# Altium schematic symbol library jlcpcb_2025_04_capacitors_extended_0402.schlib: 3594 symbols (part 12 of 20) (continued)
## FN15X102K500PNG
designator C?  Capacitance: 1nF  (hidden comment: *)
Capacitor, Ceramic (MLCC), 1nF, ±10%, 50V, X7R, ±10%, SMD 0402; Manufacturer: PSA(Prosperity Dielectrics); Manufacturer Part Number: FN15X102K500PNG; Package Size: 0402; JLCPCB Basic Part: No; JLCPCB Part Number: C328911; Supplier 1: LCSC; Category: Capacitors - MLCC; Supplier Part Number 1: C328911; Tolerance: ±10%; Voltage Rating: 50V; Temperature Coefficient: X7R; RoHS: Yes; ComponentLink1Description: Datasheet; ComponentLink1URL: https://wmsc.lcsc.com/wmsc/upload/file/pdf/v2/lcsc/2304140030_PSA-Prosperity-Dielectrics-FN15X102K500PNG_C328911.pdf; ComponentLink2Description: JLCPCB Part URL; ComponentLink2URL: https://jlcpcb.com/partdetail/C328911; ComponentLink3Description: LCSC Part URL; ComponentLink3URL: https://lcsc.com/product-detail/Multilayer-Ceramic-Capacitors-MLCC---SMD-SMT_PSAProsperity-Dielectrics-PSAProsperity-Dielectrics-FN15X102K500PNG_C328911.html
footprint CAP-0402 (0402 (1005M) Capacitor)
pins: 1, 2

## FN15X103J500PNG
designator C?  Capacitance: 10nF  (hidden comment: *)
Capacitor, Ceramic (MLCC), 10nF, ±5%, 50V, X7R, ±5%, SMD 0402; Manufacturer: PSA(Prosperity Dielectrics); Manufacturer Part Number: FN15X103J500PNG; Package Size: 0402; JLCPCB Basic Part: No; JLCPCB Part Number: C363529; Supplier 1: LCSC; Category: Capacitors - MLCC; Supplier Part Number 1: C363529; Tolerance: ±5%; Voltage Rating: 50V; Temperature Coefficient: X7R; RoHS: Yes; ComponentLink1Description: Datasheet; ComponentLink1URL: https://wmsc.lcsc.com/wmsc/upload/file/pdf/v2/lcsc/2304140030_PSA-Prosperity-Dielectrics-FN15X103J500PNG_C363529.pdf; ComponentLink2Description: JLCPCB Part URL; ComponentLink2URL: https://jlcpcb.com/partdetail/C363529; ComponentLink3Description: LCSC Part URL; ComponentLink3URL: https://lcsc.com/product-detail/Multilayer-Ceramic-Capacitors-MLCC---SMD-SMT_PSAProsperity-Dielectrics-PSAProsperity-Dielectrics-FN15X103J500PNG_C363529.html
footprint CAP-0402 (0402 (1005M) Capacitor)
pins: 1, 2

## FN15X103K160PNG
designator C?  Capacitance: 10nF  (hidden comment: *)
Capacitor, Ceramic (MLCC), 10nF, 16V, X7R, SMD 0402; Manufacturer: PSA(Prosperity Dielectrics); Manufacturer Part Number: FN15X103K160PNG; Package Size: 0402; JLCPCB Basic Part: No; JLCPCB Part Number: C2875126; Supplier 1: LCSC; Category: Capacitors - MLCC; Supplier Part Number 1: C2875126; Voltage Rating: 16V; Temperature Coefficient: X7R; RoHS: Yes; ComponentLink1Description: Datasheet; ComponentLink1URL: https://wmsc.lcsc.com/wmsc/upload/file/pdf/v2/lcsc/2109171130_PSA-Prosperity-Dielectrics-FN15X103K160PNG_C2875126.pdf; ComponentLink2Description: JLCPCB Part URL; ComponentLink2URL: https://jlcpcb.com/partdetail/C2875126; ComponentLink3Description: LCSC Part URL; ComponentLink3URL: https://lcsc.com/product-detail/Multilayer-Ceramic-Capacitors-MLCC---SMD-SMT_PSAProsperity-Dielectrics-PSAProsperity-Dielectrics-FN15X103K160PNG_C2875126.html
footprint CAP-0402 (0402 (1005M) Capacitor)
pins: 1, 2

## FN15X103K250PNG
designator C?  Capacitance: 10nF  (hidden comment: *)
Capacitor, Ceramic (MLCC), 10nF, ±10%, 25V, X7R, ±10%, SMD 0402; Manufacturer: PSA(Prosperity Dielectrics); Manufacturer Part Number: FN15X103K250PNG; Package Size: 0402; JLCPCB Basic Part: No; JLCPCB Part Number: C525224; Supplier 1: LCSC; Category: Capacitors - MLCC; Supplier Part Number 1: C525224; Tolerance: ±10%; Voltage Rating: 25V; Temperature Coefficient: X7R; RoHS: Yes; ComponentLink1Description: Datasheet; ComponentLink1URL: https://wmsc.lcsc.com/wmsc/upload/file/pdf/v2/lcsc/2304140030_PSA-Prosperity-Dielectrics-FN15X103K250PNG_C525224.pdf; ComponentLink2Description: JLCPCB Part URL; ComponentLink2URL: https://jlcpcb.com/partdetail/C525224; ComponentLink3Description: LCSC Part URL; ComponentLink3URL: https://lcsc.com/product-detail/Multilayer-Ceramic-Capacitors-MLCC---SMD-SMT_PSAProsperity-Dielectrics-PSAProsperity-Dielectrics-FN15X103K250PNG_C525224.html
footprint CAP-0402 (0402 (1005M) Capacitor)
pins: 1, 2

## FN15X103K500PNG
designator C?  Capacitance: 10nF  (hidden comment: *)
Capacitor, Ceramic (MLCC), 10nF, ±10%, 50V, X7R, ±10%, SMD 0402; Manufacturer: PSA(Prosperity Dielectrics); Manufacturer Part Number: FN15X103K500PNG; Package Size: 0402; JLCPCB Basic Part: No; JLCPCB Part Number: C328912; Supplier 1: LCSC; Category: Capacitors - MLCC; Supplier Part Number 1: C328912; Tolerance: ±10%; Voltage Rating: 50V; Temperature Coefficient: X7R; RoHS: Yes; ComponentLink1Description: Datasheet; ComponentLink1URL: https://wmsc.lcsc.com/wmsc/upload/file/pdf/v2/lcsc/2304140030_PSA-Prosperity-Dielectrics-FN15X103K500PNG_C328912.pdf; ComponentLink2Description: JLCPCB Part URL; ComponentLink2URL: https://jlcpcb.com/partdetail/C328912; ComponentLink3Description: LCSC Part URL; ComponentLink3URL: https://lcsc.com/product-detail/Multilayer-Ceramic-Capacitors-MLCC---SMD-SMT_PSAProsperity-Dielectrics-PSAProsperity-Dielectrics-FN15X103K500PNG_C328912.html
footprint CAP-0402 (0402 (1005M) Capacitor)
pins: 1, 2

## FN15X104J160PNG
designator C?  Capacitance: 100nF  (hidden comment: *)
Capacitor, Ceramic (MLCC), 100nF, ±5%, 16V, X7R, ±5%, SMD 0402; Manufacturer: PSA(Prosperity Dielectrics); Manufacturer Part Number: FN15X104J160PNG; Package Size: 0402; JLCPCB Basic Part: No; JLCPCB Part Number: C363530; Supplier 1: LCSC; Category: Capacitors - MLCC; Supplier Part Number 1: C363530; Tolerance: ±5%; Voltage Rating: 16V; Temperature Coefficient: X7R; RoHS: Yes; ComponentLink1Description: Datasheet; ComponentLink1URL: https://wmsc.lcsc.com/wmsc/upload/file/pdf/v2/lcsc/2304140030_PSA-Prosperity-Dielectrics-FN15X104J160PNG_C363530.pdf; ComponentLink2Description: JLCPCB Part URL; ComponentLink2URL: https://jlcpcb.com/partdetail/C363530; ComponentLink3Description: LCSC Part URL; ComponentLink3URL: https://lcsc.com/product-detail/Multilayer-Ceramic-Capacitors-MLCC---SMD-SMT_PSAProsperity-Dielectrics-PSAProsperity-Dielectrics-FN15X104J160PNG_C363530.html
footprint CAP-0402 (0402 (1005M) Capacitor)
pins: 1, 2

## FN15X104K160PNG
designator C?  Capacitance: 100nF  (hidden comment: *)
Capacitor, Ceramic (MLCC), 100nF, ±10%, 16V, X7R, ±10%, SMD 0402; Manufacturer: PSA(Prosperity Dielectrics); Manufacturer Part Number: FN15X104K160PNG; Package Size: 0402; JLCPCB Basic Part: No; JLCPCB Part Number: C328914; Supplier 1: LCSC; Category: Capacitors - MLCC; Supplier Part Number 1: C328914; Tolerance: ±10%; Voltage Rating: 16V; Temperature Coefficient: X7R; RoHS: Yes; ComponentLink1Description: Datasheet; ComponentLink1URL: https://wmsc.lcsc.com/wmsc/upload/file/pdf/v2/lcsc/2304140030_PSA-Prosperity-Dielectrics-FN15X104K160PNG_C328914.pdf; ComponentLink2Description: JLCPCB Part URL; ComponentLink2URL: https://jlcpcb.com/partdetail/C328914; ComponentLink3Description: LCSC Part URL; ComponentLink3URL: https://lcsc.com/product-detail/Multilayer-Ceramic-Capacitors-MLCC---SMD-SMT_PSAProsperity-Dielectrics-PSAProsperity-Dielectrics-FN15X104K160PNG_C328914.html
footprint CAP-0402 (0402 (1005M) Capacitor)
pins: 1, 2

## FN15X104K250PNG
designator C?  Capacitance: 100nF  (hidden comment: *)
Capacitor, Ceramic (MLCC), 100nF, ±10%, 25V, X7R, ±10%, SMD 0402; Manufacturer: PSA(Prosperity Dielectrics); Manufacturer Part Number: FN15X104K250PNG; Package Size: 0402; JLCPCB Basic Part: No; JLCPCB Part Number: C525225; Supplier 1: LCSC; Category: Capacitors - MLCC; Supplier Part Number 1: C525225; Tolerance: ±10%; Voltage Rating: 25V; Temperature Coefficient: X7R; RoHS: Yes; ComponentLink1Description: Datasheet; ComponentLink1URL: https://wmsc.lcsc.com/wmsc/upload/file/pdf/v2/lcsc/2304140030_PSA-Prosperity-Dielectrics-FN15X104K250PNG_C525225.pdf; ComponentLink2Description: JLCPCB Part URL; ComponentLink2URL: https://jlcpcb.com/partdetail/C525225; ComponentLink3Description: LCSC Part URL; ComponentLink3URL: https://lcsc.com/product-detail/Multilayer-Ceramic-Capacitors-MLCC---SMD-SMT_PSAProsperity-Dielectrics-PSAProsperity-Dielectrics-FN15X104K250PNG_C525225.html
footprint CAP-0402 (0402 (1005M) Capacitor)
pins: 1, 2

## FN15X104K500PKG
designator C?  Capacitance: 100nF  (hidden comment: *)
Capacitor, Ceramic (MLCC), 100nF, ±10%, 50V, X7R, ±10%, SMD 0402; Manufacturer: PSA(Prosperity Dielectrics); Manufacturer Part Number: FN15X104K500PKG; Package Size: 0402; JLCPCB Basic Part: No; JLCPCB Part Number: C525226; Supplier 1: LCSC; Category: Capacitors - MLCC; Supplier Part Number 1: C525226; Tolerance: ±10%; Voltage Rating: 50V; Temperature Coefficient: X7R; RoHS: Yes; ComponentLink1Description: Datasheet; ComponentLink1URL: https://wmsc.lcsc.com/wmsc/upload/file/pdf/v2/lcsc/2304140030_PSA-Prosperity-Dielectrics-FN15X104K500PKG_C525226.pdf; ComponentLink2Description: JLCPCB Part URL; ComponentLink2URL: https://jlcpcb.com/partdetail/C525226; ComponentLink3Description: LCSC Part URL; ComponentLink3URL: https://lcsc.com/product-detail/Multilayer-Ceramic-Capacitors-MLCC---SMD-SMT_PSAProsperity-Dielectrics-PSAProsperity-Dielectrics-FN15X104K500PKG_C525226.html
footprint CAP-0402 (0402 (1005M) Capacitor)
pins: 1, 2

## FN15X104M160PNG
designator C?  Capacitance: 100nF  (hidden comment: *)
Capacitor, Ceramic (MLCC), 100nF, 16V, X7R, SMD 0402; Manufacturer: PSA(Prosperity Dielectrics); Manufacturer Part Number: FN15X104M160PNG; Package Size: 0402; JLCPCB Basic Part: No; JLCPCB Part Number: C2874745; Supplier 1: LCSC; Category: Capacitors - MLCC; Supplier Part Number 1: C2874745; Voltage Rating: 16V; Temperature Coefficient: X7R; RoHS: Yes; ComponentLink1Description: Datasheet; ComponentLink1URL: https://wmsc.lcsc.com/wmsc/upload/file/pdf/v2/lcsc/2108150330_PSA-Prosperity-Dielectrics-FN15X104M160PNG_C2874745.pdf; ComponentLink2Description: JLCPCB Part URL; ComponentLink2URL: https://jlcpcb.com/partdetail/C2874745; ComponentLink3Description: LCSC Part URL; ComponentLink3URL: https://lcsc.com/product-detail/Multilayer-Ceramic-Capacitors-MLCC---SMD-SMT_PSAProsperity-Dielectrics-PSAProsperity-Dielectrics-FN15X104M160PNG_C2874745.html
footprint CAP-0402 (0402 (1005M) Capacitor)
pins: 1, 2

## FN15X151K250PNG
designator C?  Capacitance: 150pF  (hidden comment: *)
Capacitor, Ceramic (MLCC), 150pF, ±10%, 25V, X7R, ±10%, SMD 0402; Manufacturer: PSA(Prosperity Dielectrics); Manufacturer Part Number: FN15X151K250PNG; Package Size: 0402; JLCPCB Basic Part: No; JLCPCB Part Number: C561726; Supplier 1: LCSC; Category: Capacitors - MLCC; Supplier Part Number 1: C561726; Tolerance: ±10%; Voltage Rating: 25V; Temperature Coefficient: X7R; RoHS: Yes; ComponentLink1Description: Datasheet; ComponentLink2Description: JLCPCB Part URL; ComponentLink2URL: https://jlcpcb.com/partdetail/C561726; ComponentLink3Description: LCSC Part URL; ComponentLink3URL: https://lcsc.com/product-detail/Multilayer-Ceramic-Capacitors-MLCC---SMD-SMT_PSAProsperity-Dielectrics-PSAProsperity-Dielectrics-FN15X151K250PNG_C561726.html
footprint CAP-0402 (0402 (1005M) Capacitor)
pins: 1, 2

## FN15X151K500PNG
designator C?  Capacitance: 150pF  (hidden comment: *)
Capacitor, Ceramic (MLCC), 150pF, ±10%, 50V, X7R, ±10%, SMD 0402; Manufacturer: PSA(Prosperity Dielectrics); Manufacturer Part Number: FN15X151K500PNG; Package Size: 0402; JLCPCB Basic Part: No; JLCPCB Part Number: C363531; Supplier 1: LCSC; Category: Capacitors - MLCC; Supplier Part Number 1: C363531; Tolerance: ±10%; Voltage Rating: 50V; Temperature Coefficient: X7R; RoHS: Yes; ComponentLink1Description: Datasheet; ComponentLink1URL: https://wmsc.lcsc.com/wmsc/upload/file/pdf/v2/lcsc/2304140030_PSA-Prosperity-Dielectrics-FN15X151K500PNG_C363531.pdf; ComponentLink2Description: JLCPCB Part URL; ComponentLink2URL: https://jlcpcb.com/partdetail/C363531; ComponentLink3Description: LCSC Part URL; ComponentLink3URL: https://lcsc.com/product-detail/Multilayer-Ceramic-Capacitors-MLCC---SMD-SMT_PSAProsperity-Dielectrics-PSAProsperity-Dielectrics-FN15X151K500PNG_C363531.html
footprint CAP-0402 (0402 (1005M) Capacitor)
pins: 1, 2

## FN15X152J500PNG
designator C?  Capacitance: 1.5nF  (hidden comment: *)
Capacitor, Ceramic (MLCC), 1.5nF, ±5%, 50V, X7R, ±5%, SMD 0402; Manufacturer: PSA(Prosperity Dielectrics); Manufacturer Part Number: FN15X152J500PNG; Package Size: 0402; JLCPCB Basic Part: No; JLCPCB Part Number: C363291; Supplier 1: LCSC; Category: Capacitors - MLCC; Supplier Part Number 1: C363291; Tolerance: ±5%; Voltage Rating: 50V; Temperature Coefficient: X7R; RoHS: Yes; ComponentLink1Description: Datasheet; ComponentLink1URL: https://wmsc.lcsc.com/wmsc/upload/file/pdf/v2/lcsc/2304140030_PSA-Prosperity-Dielectrics-FN15X152J500PNG_C363291.pdf; ComponentLink2Description: JLCPCB Part URL; ComponentLink2URL: https://jlcpcb.com/partdetail/C363291; ComponentLink3Description: LCSC Part URL; ComponentLink3URL: https://lcsc.com/product-detail/Multilayer-Ceramic-Capacitors-MLCC---SMD-SMT_PSAProsperity-Dielectrics-PSAProsperity-Dielectrics-FN15X152J500PNG_C363291.html
footprint CAP-0402 (0402 (1005M) Capacitor)
pins: 1, 2

## FN15X152K250PNG
designator C?  Capacitance: 1.5nF  (hidden comment: *)
Capacitor, Ceramic (MLCC), 1.5nF, ±10%, 25V, ±10%, SMD 0402; Manufacturer: PSA(Prosperity Dielectrics); Manufacturer Part Number: FN15X152K250PNG; Package Size: 0402; JLCPCB Basic Part: No; JLCPCB Part Number: C561727; Supplier 1: LCSC; Category: Capacitors - MLCC; Supplier Part Number 1: C561727; Tolerance: ±10%; Voltage Rating: 25V; RoHS: Yes; ComponentLink1Description: Datasheet; ComponentLink2Description: JLCPCB Part URL; ComponentLink2URL: https://jlcpcb.com/partdetail/C561727; ComponentLink3Description: LCSC Part URL; ComponentLink3URL: https://lcsc.com/product-detail/Multilayer-Ceramic-Capacitors-MLCC---SMD-SMT_PSAProsperity-Dielectrics-PSAProsperity-Dielectrics-FN15X152K250PNG_C561727.html
footprint CAP-0402 (0402 (1005M) Capacitor)
pins: 1, 2

## FN15X153K250PNG
designator C?  Capacitance: 15nF  (hidden comment: *)
Capacitor, Ceramic (MLCC), 15nF, ±10%, 25V, X7R, ±10%, SMD 0402; Manufacturer: PSA(Prosperity Dielectrics); Manufacturer Part Number: FN15X153K250PNG; Package Size: 0402; JLCPCB Basic Part: No; JLCPCB Part Number: C565548; Supplier 1: LCSC; Category: Capacitors - MLCC; Supplier Part Number 1: C565548; Tolerance: ±10%; Voltage Rating: 25V; Temperature Coefficient: X7R; RoHS: Yes; ComponentLink1Description: Datasheet; ComponentLink2Description: JLCPCB Part URL; ComponentLink2URL: https://jlcpcb.com/partdetail/C565548; ComponentLink3Description: LCSC Part URL; ComponentLink3URL: https://lcsc.com/product-detail/Multilayer-Ceramic-Capacitors-MLCC---SMD-SMT_PSAProsperity-Dielectrics-PSAProsperity-Dielectrics-FN15X153K250PNG_C565548.html
footprint CAP-0402 (0402 (1005M) Capacitor)
pins: 1, 2

## FN15X181K250PNG
designator C?  Capacitance: 180pF  (hidden comment: *)
Capacitor, Ceramic (MLCC), 180pF, ±10%, 25V, X7R, ±10%, SMD 0402; Manufacturer: PSA(Prosperity Dielectrics); Manufacturer Part Number: FN15X181K250PNG; Package Size: 0402; JLCPCB Basic Part: No; JLCPCB Part Number: C565550; Supplier 1: LCSC; Category: Capacitors - MLCC; Supplier Part Number 1: C565550; Tolerance: ±10%; Voltage Rating: 25V; Temperature Coefficient: X7R; RoHS: Yes; ComponentLink1Description: Datasheet; ComponentLink2Description: JLCPCB Part URL; ComponentLink2URL: https://jlcpcb.com/partdetail/C565550; ComponentLink3Description: LCSC Part URL; ComponentLink3URL: https://lcsc.com/product-detail/Multilayer-Ceramic-Capacitors-MLCC---SMD-SMT_PSAProsperity-Dielectrics-PSAProsperity-Dielectrics-FN15X181K250PNG_C565550.html
footprint CAP-0402 (0402 (1005M) Capacitor)
pins: 1, 2

## FN15X182K250PNG
designator C?  Capacitance: 1.8nF  (hidden comment: *)
Capacitor, Ceramic (MLCC), 1.8nF, ±10%, 25V, ±10%, SMD 0402; Manufacturer: PSA(Prosperity Dielectrics); Manufacturer Part Number: FN15X182K250PNG; Package Size: 0402; JLCPCB Basic Part: No; JLCPCB Part Number: C565551; Supplier 1: LCSC; Category: Capacitors - MLCC; Supplier Part Number 1: C565551; Tolerance: ±10%; Voltage Rating: 25V; RoHS: Yes; ComponentLink1Description: Datasheet; ComponentLink2Description: JLCPCB Part URL; ComponentLink2URL: https://jlcpcb.com/partdetail/C565551; ComponentLink3Description: LCSC Part URL; ComponentLink3URL: https://lcsc.com/product-detail/Multilayer-Ceramic-Capacitors-MLCC---SMD-SMT_PSAProsperity-Dielectrics-PSAProsperity-Dielectrics-FN15X182K250PNG_C565551.html
footprint CAP-0402 (0402 (1005M) Capacitor)
pins: 1, 2

## FN15X183K250PNG
designator C?  Capacitance: 18nF  (hidden comment: *)
Capacitor, Ceramic (MLCC), 18nF, ±10%, 25V, X7R, ±10%, SMD 0402; Manufacturer: PSA(Prosperity Dielectrics); Manufacturer Part Number: FN15X183K250PNG; Package Size: 0402; JLCPCB Basic Part: No; JLCPCB Part Number: C565552; Supplier 1: LCSC; Category: Capacitors - MLCC; Supplier Part Number 1: C565552; Tolerance: ±10%; Voltage Rating: 25V; Temperature Coefficient: X7R; RoHS: Yes; ComponentLink1Description: Datasheet; ComponentLink2Description: JLCPCB Part URL; ComponentLink2URL: https://jlcpcb.com/partdetail/C565552; ComponentLink3Description: LCSC Part URL; ComponentLink3URL: https://lcsc.com/product-detail/Multilayer-Ceramic-Capacitors-MLCC---SMD-SMT_PSAProsperity-Dielectrics-PSAProsperity-Dielectrics-FN15X183K250PNG_C565552.html
footprint CAP-0402 (0402 (1005M) Capacitor)
pins: 1, 2

## FN15X221K250PNG
designator C?  Capacitance: 220pF  (hidden comment: *)
Capacitor, Ceramic (MLCC), 220pF, ±10%, 25V, X7R, ±10%, SMD 0402; Manufacturer: PSA(Prosperity Dielectrics); Manufacturer Part Number: FN15X221K250PNG; Package Size: 0402; JLCPCB Basic Part: No; JLCPCB Part Number: C561723; Supplier 1: LCSC; Category: Capacitors - MLCC; Supplier Part Number 1: C561723; Tolerance: ±10%; Voltage Rating: 25V; Temperature Coefficient: X7R; RoHS: Yes; ComponentLink1Description: Datasheet; ComponentLink2Description: JLCPCB Part URL; ComponentLink2URL: https://jlcpcb.com/partdetail/C561723; ComponentLink3Description: LCSC Part URL; ComponentLink3URL: https://lcsc.com/product-detail/Multilayer-Ceramic-Capacitors-MLCC---SMD-SMT_PSAProsperity-Dielectrics-PSAProsperity-Dielectrics-FN15X221K250PNG_C561723.html
footprint CAP-0402 (0402 (1005M) Capacitor)
pins: 1, 2

## FN15X221K500PNG
designator C?  Capacitance: 220pF  (hidden comment: *)
Capacitor, Ceramic (MLCC), 220pF, ±10%, 50V, X7R, ±10%, SMD 0402; Manufacturer: PSA(Prosperity Dielectrics); Manufacturer Part Number: FN15X221K500PNG; Package Size: 0402; JLCPCB Basic Part: No; JLCPCB Part Number: C363533; Supplier 1: LCSC; Category: Capacitors - MLCC; Supplier Part Number 1: C363533; Tolerance: ±10%; Voltage Rating: 50V; Temperature Coefficient: X7R; RoHS: Yes; ComponentLink1Description: Datasheet; ComponentLink1URL: https://wmsc.lcsc.com/wmsc/upload/file/pdf/v2/lcsc/2304140030_PSA-Prosperity-Dielectrics-FN15X221K500PNG_C363533.pdf; ComponentLink2Description: JLCPCB Part URL; ComponentLink2URL: https://jlcpcb.com/partdetail/C363533; ComponentLink3Description: LCSC Part URL; ComponentLink3URL: https://lcsc.com/product-detail/Multilayer-Ceramic-Capacitors-MLCC---SMD-SMT_PSAProsperity-Dielectrics-PSAProsperity-Dielectrics-FN15X221K500PNG_C363533.html
footprint CAP-0402 (0402 (1005M) Capacitor)
pins: 1, 2

## FN15X222K250PNG
designator C?  Capacitance: 2.2nF  (hidden comment: *)
Capacitor, Ceramic (MLCC), 2.2nF, ±10%, 25V, X7R, ±10%, SMD 0402; Manufacturer: PSA(Prosperity Dielectrics); Manufacturer Part Number: FN15X222K250PNG; Package Size: 0402; JLCPCB Basic Part: No; JLCPCB Part Number: C561724; Supplier 1: LCSC; Category: Capacitors - MLCC; Supplier Part Number 1: C561724; Tolerance: ±10%; Voltage Rating: 25V; Temperature Coefficient: X7R; RoHS: Yes; ComponentLink1Description: Datasheet; ComponentLink2Description: JLCPCB Part URL; ComponentLink2URL: https://jlcpcb.com/partdetail/C561724; ComponentLink3Description: LCSC Part URL; ComponentLink3URL: https://lcsc.com/product-detail/Multilayer-Ceramic-Capacitors-MLCC---SMD-SMT_PSAProsperity-Dielectrics-PSAProsperity-Dielectrics-FN15X222K250PNG_C561724.html
footprint CAP-0402 (0402 (1005M) Capacitor)
pins: 1, 2

## FN15X222K500PNG
designator C?  Capacitance: 2.2nF  (hidden comment: *)
Capacitor, Ceramic (MLCC), 2.2nF, ±10%, 50V, X7R, ±10%, SMD 0402; Manufacturer: PSA(Prosperity Dielectrics); Manufacturer Part Number: FN15X222K500PNG; Package Size: 0402; JLCPCB Basic Part: No; JLCPCB Part Number: C2915669; Supplier 1: LCSC; Category: Capacitors - MLCC; Supplier Part Number 1: C2915669; Tolerance: ±10%; Voltage Rating: 50V; Temperature Coefficient: X7R; RoHS: Yes; ComponentLink1Description: Datasheet; ComponentLink1URL: https://wmsc.lcsc.com/wmsc/upload/file/pdf/v2/lcsc/2111172030_PSA-Prosperity-Dielectrics-FN15X222K500PNG_C2915669.pdf; ComponentLink2Description: JLCPCB Part URL; ComponentLink2URL: https://jlcpcb.com/partdetail/C2915669; ComponentLink3Description: LCSC Part URL; ComponentLink3URL: https://lcsc.com/product-detail/Multilayer-Ceramic-Capacitors-MLCC---SMD-SMT_PSAProsperity-Dielectrics-PSAProsperity-Dielectrics-FN15X222K500PNG_C2915669.html
footprint CAP-0402 (0402 (1005M) Capacitor)
pins: 1, 2

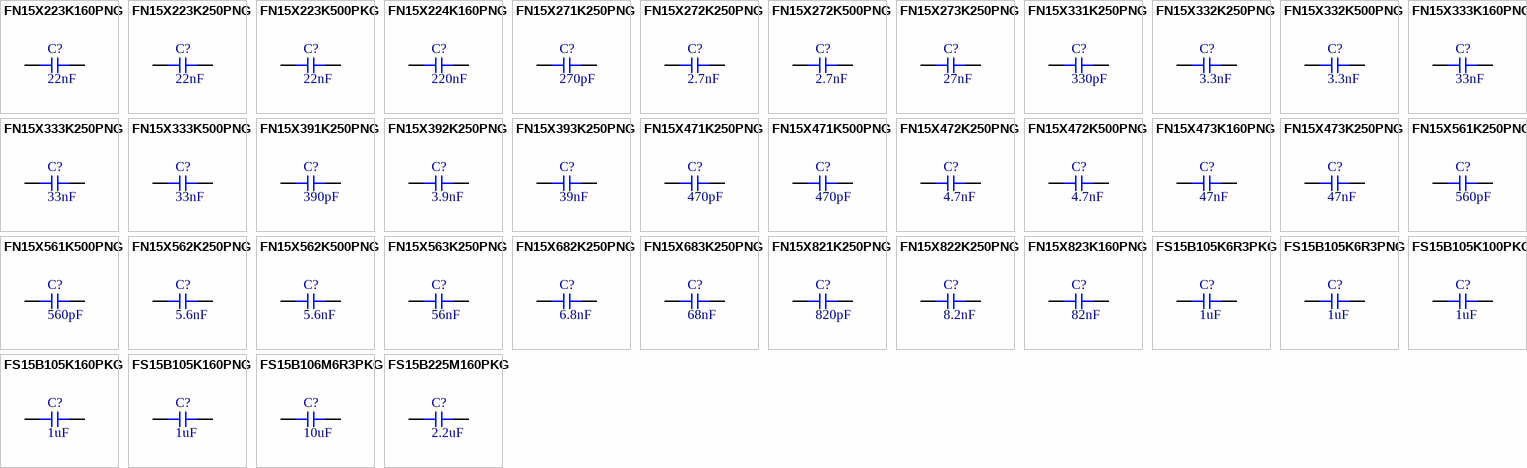
[diagram p54: symbols FN15X223K160PNG to FS15B225M160PKG]

## FN15X223K160PNG
designator C?  Capacitance: 22nF  (hidden comment: *)
Capacitor, Ceramic (MLCC), 22nF, ±10%, 16V, X7R, ±10%, SMD 0402; Manufacturer: PSA(Prosperity Dielectrics); Manufacturer Part Number: FN15X223K160PNG; Package Size: 0402; JLCPCB Basic Part: No; JLCPCB Part Number: C363534; Supplier 1: LCSC; Category: Capacitors - MLCC; Supplier Part Number 1: C363534; Tolerance: ±10%; Voltage Rating: 16V; Temperature Coefficient: X7R; RoHS: Yes; ComponentLink1Description: Datasheet; ComponentLink1URL: https://wmsc.lcsc.com/wmsc/upload/file/pdf/v2/lcsc/2304140030_PSA-Prosperity-Dielectrics-FN15X223K160PNG_C363534.pdf; ComponentLink2Description: JLCPCB Part URL; ComponentLink2URL: https://jlcpcb.com/partdetail/C363534; ComponentLink3Description: LCSC Part URL; ComponentLink3URL: https://lcsc.com/product-detail/Multilayer-Ceramic-Capacitors-MLCC---SMD-SMT_PSAProsperity-Dielectrics-PSAProsperity-Dielectrics-FN15X223K160PNG_C363534.html
footprint CAP-0402 (0402 (1005M) Capacitor)
pins: 1, 2

## FN15X223K250PNG
designator C?  Capacitance: 22nF  (hidden comment: *)
Capacitor, Ceramic (MLCC), 22nF, ±10%, 25V, X7R, ±10%, SMD 0402; Manufacturer: PSA(Prosperity Dielectrics); Manufacturer Part Number: FN15X223K250PNG; Package Size: 0402; JLCPCB Basic Part: No; JLCPCB Part Number: C363535; Supplier 1: LCSC; Category: Capacitors - MLCC; Supplier Part Number 1: C363535; Tolerance: ±10%; Voltage Rating: 25V; Temperature Coefficient: X7R; RoHS: Yes; ComponentLink1Description: Datasheet; ComponentLink1URL: https://wmsc.lcsc.com/wmsc/upload/file/pdf/v2/lcsc/2304140030_PSA-Prosperity-Dielectrics-FN15X223K250PNG_C363535.pdf; ComponentLink2Description: JLCPCB Part URL; ComponentLink2URL: https://jlcpcb.com/partdetail/C363535; ComponentLink3Description: LCSC Part URL; ComponentLink3URL: https://lcsc.com/product-detail/Multilayer-Ceramic-Capacitors-MLCC---SMD-SMT_PSAProsperity-Dielectrics-PSAProsperity-Dielectrics-FN15X223K250PNG_C363535.html
footprint CAP-0402 (0402 (1005M) Capacitor)
pins: 1, 2

## FN15X223K500PKG
designator C?  Capacitance: 22nF  (hidden comment: *)
Capacitor, Ceramic (MLCC), 22nF, ±10%, 50V, X7R, ±10%, SMD 0402; Manufacturer: PSA(Prosperity Dielectrics); Manufacturer Part Number: FN15X223K500PKG; Package Size: 0402; JLCPCB Basic Part: No; JLCPCB Part Number: C525228; Supplier 1: LCSC; Category: Capacitors - MLCC; Supplier Part Number 1: C525228; Tolerance: ±10%; Voltage Rating: 50V; Temperature Coefficient: X7R; RoHS: Yes; ComponentLink1Description: Datasheet; ComponentLink1URL: https://wmsc.lcsc.com/wmsc/upload/file/pdf/v2/lcsc/2304140030_PSA-Prosperity-Dielectrics-FN15X223K500PKG_C525228.pdf; ComponentLink2Description: JLCPCB Part URL; ComponentLink2URL: https://jlcpcb.com/partdetail/C525228; ComponentLink3Description: LCSC Part URL; ComponentLink3URL: https://lcsc.com/product-detail/Multilayer-Ceramic-Capacitors-MLCC---SMD-SMT_PSAProsperity-Dielectrics-PSAProsperity-Dielectrics-FN15X223K500PKG_C525228.html
footprint CAP-0402 (0402 (1005M) Capacitor)
pins: 1, 2

## FN15X224K160PNG
designator C?  Capacitance: 220nF  (hidden comment: *)
Capacitor, Ceramic (MLCC), 220nF, ±10%, 16V, X7R, ±10%, SMD 0402; Manufacturer: PSA(Prosperity Dielectrics); Manufacturer Part Number: FN15X224K160PNG; Package Size: 0402; JLCPCB Basic Part: No; JLCPCB Part Number: C525229; Supplier 1: LCSC; Category: Capacitors - MLCC; Supplier Part Number 1: C525229; Tolerance: ±10%; Voltage Rating: 16V; Temperature Coefficient: X7R; RoHS: Yes; ComponentLink1Description: Datasheet; ComponentLink1URL: https://wmsc.lcsc.com/wmsc/upload/file/pdf/v2/lcsc/2304140030_PSA-Prosperity-Dielectrics-FN15X224K160PNG_C525229.pdf; ComponentLink2Description: JLCPCB Part URL; ComponentLink2URL: https://jlcpcb.com/partdetail/C525229; ComponentLink3Description: LCSC Part URL; ComponentLink3URL: https://lcsc.com/product-detail/Multilayer-Ceramic-Capacitors-MLCC---SMD-SMT_PSAProsperity-Dielectrics-PSAProsperity-Dielectrics-FN15X224K160PNG_C525229.html
footprint CAP-0402 (0402 (1005M) Capacitor)
pins: 1, 2

## FN15X271K250PNG
designator C?  Capacitance: 270pF  (hidden comment: *)
Capacitor, Ceramic (MLCC), 270pF, ±10%, 25V, X7R, ±10%, SMD 0402; Manufacturer: PSA(Prosperity Dielectrics); Manufacturer Part Number: FN15X271K250PNG; Package Size: 0402; JLCPCB Basic Part: No; JLCPCB Part Number: C565553; Supplier 1: LCSC; Category: Capacitors - MLCC; Supplier Part Number 1: C565553; Tolerance: ±10%; Voltage Rating: 25V; Temperature Coefficient: X7R; RoHS: Yes; ComponentLink1Description: Datasheet; ComponentLink2Description: JLCPCB Part URL; ComponentLink2URL: https://jlcpcb.com/partdetail/C565553; ComponentLink3Description: LCSC Part URL; ComponentLink3URL: https://lcsc.com/product-detail/Multilayer-Ceramic-Capacitors-MLCC---SMD-SMT_PSAProsperity-Dielectrics-PSAProsperity-Dielectrics-FN15X271K250PNG_C565553.html
footprint CAP-0402 (0402 (1005M) Capacitor)
pins: 1, 2

## FN15X272K250PNG
designator C?  Capacitance: 2.7nF  (hidden comment: *)
Capacitor, Ceramic (MLCC), 2.7nF, ±10%, 25V, X7R, ±10%, SMD 0402; Manufacturer: PSA(Prosperity Dielectrics); Manufacturer Part Number: FN15X272K250PNG; Package Size: 0402; JLCPCB Basic Part: No; JLCPCB Part Number: C565554; Supplier 1: LCSC; Category: Capacitors - MLCC; Supplier Part Number 1: C565554; Tolerance: ±10%; Voltage Rating: 25V; Temperature Coefficient: X7R; RoHS: Yes; ComponentLink1Description: Datasheet; ComponentLink2Description: JLCPCB Part URL; ComponentLink2URL: https://jlcpcb.com/partdetail/C565554; ComponentLink3Description: LCSC Part URL; ComponentLink3URL: https://lcsc.com/product-detail/Multilayer-Ceramic-Capacitors-MLCC---SMD-SMT_PSAProsperity-Dielectrics-PSAProsperity-Dielectrics-FN15X272K250PNG_C565554.html
footprint CAP-0402 (0402 (1005M) Capacitor)
pins: 1, 2

## FN15X272K500PNG
designator C?  Capacitance: 2.7nF  (hidden comment: *)
Capacitor, Ceramic (MLCC), 2.7nF, ±10%, 50V, X7R, ±10%, SMD 0402; Manufacturer: PSA(Prosperity Dielectrics); Manufacturer Part Number: FN15X272K500PNG; Package Size: 0402; JLCPCB Basic Part: No; JLCPCB Part Number: C525230; Supplier 1: LCSC; Category: Capacitors - MLCC; Supplier Part Number 1: C525230; Tolerance: ±10%; Voltage Rating: 50V; Temperature Coefficient: X7R; RoHS: Yes; ComponentLink1Description: Datasheet; ComponentLink1URL: https://wmsc.lcsc.com/wmsc/upload/file/pdf/v2/lcsc/2304140030_PSA-Prosperity-Dielectrics-FN15X272K500PNG_C525230.pdf; ComponentLink2Description: JLCPCB Part URL; ComponentLink2URL: https://jlcpcb.com/partdetail/C525230; ComponentLink3Description: LCSC Part URL; ComponentLink3URL: https://lcsc.com/product-detail/Multilayer-Ceramic-Capacitors-MLCC---SMD-SMT_PSAProsperity-Dielectrics-PSAProsperity-Dielectrics-FN15X272K500PNG_C525230.html
footprint CAP-0402 (0402 (1005M) Capacitor)
pins: 1, 2

## FN15X273K250PNG
designator C?  Capacitance: 27nF  (hidden comment: *)
Capacitor, Ceramic (MLCC), 27nF, ±10%, 25V, X7R, ±10%, SMD 0402; Manufacturer: PSA(Prosperity Dielectrics); Manufacturer Part Number: FN15X273K250PNG; Package Size: 0402; JLCPCB Basic Part: No; JLCPCB Part Number: C565555; Supplier 1: LCSC; Category: Capacitors - MLCC; Supplier Part Number 1: C565555; Tolerance: ±10%; Voltage Rating: 25V; Temperature Coefficient: X7R; RoHS: Yes; ComponentLink1Description: Datasheet; ComponentLink2Description: JLCPCB Part URL; ComponentLink2URL: https://jlcpcb.com/partdetail/C565555; ComponentLink3Description: LCSC Part URL; ComponentLink3URL: https://lcsc.com/product-detail/Multilayer-Ceramic-Capacitors-MLCC---SMD-SMT_PSAProsperity-Dielectrics-PSAProsperity-Dielectrics-FN15X273K250PNG_C565555.html
footprint CAP-0402 (0402 (1005M) Capacitor)
pins: 1, 2

## FN15X331K250PNG
designator C?  Capacitance: 330pF  (hidden comment: *)
Capacitor, Ceramic (MLCC), 330pF, ±10%, 25V, ±10%, SMD 0402; Manufacturer: PSA(Prosperity Dielectrics); Manufacturer Part Number: FN15X331K250PNG; Package Size: 0402; JLCPCB Basic Part: No; JLCPCB Part Number: C561728; Supplier 1: LCSC; Category: Capacitors - MLCC; Supplier Part Number 1: C561728; Tolerance: ±10%; Voltage Rating: 25V; RoHS: Yes; ComponentLink1Description: Datasheet; ComponentLink2Description: JLCPCB Part URL; ComponentLink2URL: https://jlcpcb.com/partdetail/C561728; ComponentLink3Description: LCSC Part URL; ComponentLink3URL: https://lcsc.com/product-detail/Multilayer-Ceramic-Capacitors-MLCC---SMD-SMT_PSAProsperity-Dielectrics-PSAProsperity-Dielectrics-FN15X331K250PNG_C561728.html
footprint CAP-0402 (0402 (1005M) Capacitor)
pins: 1, 2

## FN15X332K250PNG
designator C?  Capacitance: 3.3nF  (hidden comment: *)
Capacitor, Ceramic (MLCC), 3.3nF, ±10%, 25V, X7R, ±10%, SMD 0402; Manufacturer: PSA(Prosperity Dielectrics); Manufacturer Part Number: FN15X332K250PNG; Package Size: 0402; JLCPCB Basic Part: No; JLCPCB Part Number: C561729; Supplier 1: LCSC; Category: Capacitors - MLCC; Supplier Part Number 1: C561729; Tolerance: ±10%; Voltage Rating: 25V; Temperature Coefficient: X7R; RoHS: Yes; ComponentLink1Description: Datasheet; ComponentLink2Description: JLCPCB Part URL; ComponentLink2URL: https://jlcpcb.com/partdetail/C561729; ComponentLink3Description: LCSC Part URL; ComponentLink3URL: https://lcsc.com/product-detail/Multilayer-Ceramic-Capacitors-MLCC---SMD-SMT_PSAProsperity-Dielectrics-PSAProsperity-Dielectrics-FN15X332K250PNG_C561729.html
footprint CAP-0402 (0402 (1005M) Capacitor)
pins: 1, 2

## FN15X332K500PNG
designator C?  Capacitance: 3.3nF  (hidden comment: *)
Capacitor, Ceramic (MLCC), 3.3nF, ±10%, 50V, X7R, ±10%, SMD 0402; Manufacturer: PSA(Prosperity Dielectrics); Manufacturer Part Number: FN15X332K500PNG; Package Size: 0402; JLCPCB Basic Part: No; JLCPCB Part Number: C363537; Supplier 1: LCSC; Category: Capacitors - MLCC; Supplier Part Number 1: C363537; Tolerance: ±10%; Voltage Rating: 50V; Temperature Coefficient: X7R; RoHS: Yes; ComponentLink1Description: Datasheet; ComponentLink1URL: https://wmsc.lcsc.com/wmsc/upload/file/pdf/v2/lcsc/2304140030_PSA-Prosperity-Dielectrics-FN15X332K500PNG_C363537.pdf; ComponentLink2Description: JLCPCB Part URL; ComponentLink2URL: https://jlcpcb.com/partdetail/C363537; ComponentLink3Description: LCSC Part URL; ComponentLink3URL: https://lcsc.com/product-detail/Multilayer-Ceramic-Capacitors-MLCC---SMD-SMT_PSAProsperity-Dielectrics-PSAProsperity-Dielectrics-FN15X332K500PNG_C363537.html
footprint CAP-0402 (0402 (1005M) Capacitor)
pins: 1, 2

## FN15X333K160PNG
designator C?  Capacitance: 33nF  (hidden comment: *)
Capacitor, Ceramic (MLCC), 33nF, ±10%, 16V, X7R, ±10%, SMD 0402; Manufacturer: PSA(Prosperity Dielectrics); Manufacturer Part Number: FN15X333K160PNG; Package Size: 0402; JLCPCB Basic Part: No; JLCPCB Part Number: C363538; Supplier 1: LCSC; Category: Capacitors - MLCC; Supplier Part Number 1: C363538; Tolerance: ±10%; Voltage Rating: 16V; Temperature Coefficient: X7R; RoHS: Yes; ComponentLink1Description: Datasheet; ComponentLink1URL: https://wmsc.lcsc.com/wmsc/upload/file/pdf/v2/lcsc/2304140030_PSA-Prosperity-Dielectrics-FN15X333K160PNG_C363538.pdf; ComponentLink2Description: JLCPCB Part URL; ComponentLink2URL: https://jlcpcb.com/partdetail/C363538; ComponentLink3Description: LCSC Part URL; ComponentLink3URL: https://lcsc.com/product-detail/Multilayer-Ceramic-Capacitors-MLCC---SMD-SMT_PSAProsperity-Dielectrics-PSAProsperity-Dielectrics-FN15X333K160PNG_C363538.html
footprint CAP-0402 (0402 (1005M) Capacitor)
pins: 1, 2

## FN15X333K250PNG
designator C?  Capacitance: 33nF  (hidden comment: *)
Capacitor, Ceramic (MLCC), 33nF, ±10%, 25V, X7R, ±10%, SMD 0402; Manufacturer: PSA(Prosperity Dielectrics); Manufacturer Part Number: FN15X333K250PNG; Package Size: 0402; JLCPCB Basic Part: No; JLCPCB Part Number: C565549; Supplier 1: LCSC; Category: Capacitors - MLCC; Supplier Part Number 1: C565549; Tolerance: ±10%; Voltage Rating: 25V; Temperature Coefficient: X7R; RoHS: Yes; ComponentLink1Description: Datasheet; ComponentLink2Description: JLCPCB Part URL; ComponentLink2URL: https://jlcpcb.com/partdetail/C565549; ComponentLink3Description: LCSC Part URL; ComponentLink3URL: https://lcsc.com/product-detail/Multilayer-Ceramic-Capacitors-MLCC---SMD-SMT_PSAProsperity-Dielectrics-PSAProsperity-Dielectrics-FN15X333K250PNG_C565549.html
footprint CAP-0402 (0402 (1005M) Capacitor)
pins: 1, 2

## FN15X333K500PNG
designator C?  Capacitance: 33nF  (hidden comment: *)
Capacitor, Ceramic (MLCC), 33nF, 50V, X7R, SMD 0402; Manufacturer: PSA(Prosperity Dielectrics); Manufacturer Part Number: FN15X333K500PNG; Package Size: 0402; JLCPCB Basic Part: No; JLCPCB Part Number: C3029514; Supplier 1: LCSC; Category: Capacitors - MLCC; Supplier Part Number 1: C3029514; Voltage Rating: 50V; Temperature Coefficient: X7R; RoHS: Yes; ComponentLink1Description: Datasheet; ComponentLink1URL: https://wmsc.lcsc.com/wmsc/upload/file/pdf/v2/lcsc/2205301745_PSA-Prosperity-Dielectrics-FN15X333K500PNG_C3029514.pdf; ComponentLink2Description: JLCPCB Part URL; ComponentLink2URL: https://jlcpcb.com/partdetail/C3029514; ComponentLink3Description: LCSC Part URL; ComponentLink3URL: https://lcsc.com/product-detail/Multilayer-Ceramic-Capacitors-MLCC---SMD-SMT_PSAProsperity-Dielectrics-PSAProsperity-Dielectrics-FN15X333K500PNG_C3029514.html
footprint CAP-0402 (0402 (1005M) Capacitor)
pins: 1, 2

## FN15X391K250PNG
designator C?  Capacitance: 390pF  (hidden comment: *)
Capacitor, Ceramic (MLCC), 390pF, ±10%, 25V, X7R, ±10%, SMD 0402; Manufacturer: PSA(Prosperity Dielectrics); Manufacturer Part Number: FN15X391K250PNG; Package Size: 0402; JLCPCB Basic Part: No; JLCPCB Part Number: C565556; Supplier 1: LCSC; Category: Capacitors - MLCC; Supplier Part Number 1: C565556; Tolerance: ±10%; Voltage Rating: 25V; Temperature Coefficient: X7R; RoHS: Yes; ComponentLink1Description: Datasheet; ComponentLink2Description: JLCPCB Part URL; ComponentLink2URL: https://jlcpcb.com/partdetail/C565556; ComponentLink3Description: LCSC Part URL; ComponentLink3URL: https://lcsc.com/product-detail/Multilayer-Ceramic-Capacitors-MLCC---SMD-SMT_PSAProsperity-Dielectrics-PSAProsperity-Dielectrics-FN15X391K250PNG_C565556.html
footprint CAP-0402 (0402 (1005M) Capacitor)
pins: 1, 2

## FN15X392K250PNG
designator C?  Capacitance: 3.9nF  (hidden comment: *)
Capacitor, Ceramic (MLCC), 3.9nF, ±10%, 25V, X7R, ±10%, SMD 0402; Manufacturer: PSA(Prosperity Dielectrics); Manufacturer Part Number: FN15X392K250PNG; Package Size: 0402; JLCPCB Basic Part: No; JLCPCB Part Number: C565557; Supplier 1: LCSC; Category: Capacitors - MLCC; Supplier Part Number 1: C565557; Tolerance: ±10%; Voltage Rating: 25V; Temperature Coefficient: X7R; RoHS: Yes; ComponentLink1Description: Datasheet; ComponentLink2Description: JLCPCB Part URL; ComponentLink2URL: https://jlcpcb.com/partdetail/C565557; ComponentLink3Description: LCSC Part URL; ComponentLink3URL: https://lcsc.com/product-detail/Multilayer-Ceramic-Capacitors-MLCC---SMD-SMT_PSAProsperity-Dielectrics-PSAProsperity-Dielectrics-FN15X392K250PNG_C565557.html
footprint CAP-0402 (0402 (1005M) Capacitor)
pins: 1, 2

## FN15X393K250PNG
designator C?  Capacitance: 39nF  (hidden comment: *)
Capacitor, Ceramic (MLCC), 39nF, ±10%, 25V, ±10%, SMD 0402; Manufacturer: PSA(Prosperity Dielectrics); Manufacturer Part Number: FN15X393K250PNG; Package Size: 0402; JLCPCB Basic Part: No; JLCPCB Part Number: C565558; Supplier 1: LCSC; Category: Capacitors - MLCC; Supplier Part Number 1: C565558; Tolerance: ±10%; Voltage Rating: 25V; RoHS: Yes; ComponentLink1Description: Datasheet; ComponentLink2Description: JLCPCB Part URL; ComponentLink2URL: https://jlcpcb.com/partdetail/C565558; ComponentLink3Description: LCSC Part URL; ComponentLink3URL: https://lcsc.com/product-detail/Multilayer-Ceramic-Capacitors-MLCC---SMD-SMT_PSAProsperity-Dielectrics-PSAProsperity-Dielectrics-FN15X393K250PNG_C565558.html
footprint CAP-0402 (0402 (1005M) Capacitor)
pins: 1, 2

## FN15X471K250PNG
designator C?  Capacitance: 470pF  (hidden comment: *)
Capacitor, Ceramic (MLCC), 470pF, ±10%, 25V, ±10%, SMD 0402; Manufacturer: PSA(Prosperity Dielectrics); Manufacturer Part Number: FN15X471K250PNG; Package Size: 0402; JLCPCB Basic Part: No; JLCPCB Part Number: C561725; Supplier 1: LCSC; Category: Capacitors - MLCC; Supplier Part Number 1: C561725; Tolerance: ±10%; Voltage Rating: 25V; RoHS: Yes; ComponentLink1Description: Datasheet; ComponentLink2Description: JLCPCB Part URL; ComponentLink2URL: https://jlcpcb.com/partdetail/C561725; ComponentLink3Description: LCSC Part URL; ComponentLink3URL: https://lcsc.com/product-detail/Multilayer-Ceramic-Capacitors-MLCC---SMD-SMT_PSAProsperity-Dielectrics-PSAProsperity-Dielectrics-FN15X471K250PNG_C561725.html
footprint CAP-0402 (0402 (1005M) Capacitor)
pins: 1, 2

## FN15X471K500PNG
designator C?  Capacitance: 470pF  (hidden comment: *)
Capacitor, Ceramic (MLCC), 470pF, ±10%, 50V, X7R, ±10%, SMD 0402; Manufacturer: PSA(Prosperity Dielectrics); Manufacturer Part Number: FN15X471K500PNG; Package Size: 0402; JLCPCB Basic Part: No; JLCPCB Part Number: C363540; Supplier 1: LCSC; Category: Capacitors - MLCC; Supplier Part Number 1: C363540; Tolerance: ±10%; Voltage Rating: 50V; Temperature Coefficient: X7R; RoHS: Yes; ComponentLink1Description: Datasheet; ComponentLink1URL: https://wmsc.lcsc.com/wmsc/upload/file/pdf/v2/lcsc/2304140030_PSA-Prosperity-Dielectrics-FN15X471K500PNG_C363540.pdf; ComponentLink2Description: JLCPCB Part URL; ComponentLink2URL: https://jlcpcb.com/partdetail/C363540; ComponentLink3Description: LCSC Part URL; ComponentLink3URL: https://lcsc.com/product-detail/Multilayer-Ceramic-Capacitors-MLCC---SMD-SMT_PSAProsperity-Dielectrics-PSAProsperity-Dielectrics-FN15X471K500PNG_C363540.html
footprint CAP-0402 (0402 (1005M) Capacitor)
pins: 1, 2

## FN15X472K250PNG
designator C?  Capacitance: 4.7nF  (hidden comment: *)
Capacitor, Ceramic (MLCC), 4.7nF, ±10%, 25V, X7R, ±10%, SMD 0402; Manufacturer: PSA(Prosperity Dielectrics); Manufacturer Part Number: FN15X472K250PNG; Package Size: 0402; JLCPCB Basic Part: No; JLCPCB Part Number: C525231; Supplier 1: LCSC; Category: Capacitors - MLCC; Supplier Part Number 1: C525231; Tolerance: ±10%; Voltage Rating: 25V; Temperature Coefficient: X7R; RoHS: Yes; ComponentLink1Description: Datasheet; ComponentLink1URL: https://wmsc.lcsc.com/wmsc/upload/file/pdf/v2/lcsc/2304140030_PSA-Prosperity-Dielectrics-FN15X472K250PNG_C525231.pdf; ComponentLink2Description: JLCPCB Part URL; ComponentLink2URL: https://jlcpcb.com/partdetail/C525231; ComponentLink3Description: LCSC Part URL; ComponentLink3URL: https://lcsc.com/product-detail/Multilayer-Ceramic-Capacitors-MLCC---SMD-SMT_PSAProsperity-Dielectrics-PSAProsperity-Dielectrics-FN15X472K250PNG_C525231.html
footprint CAP-0402 (0402 (1005M) Capacitor)
pins: 1, 2

## FN15X472K500PNG
designator C?  Capacitance: 4.7nF  (hidden comment: *)
Capacitor, Ceramic (MLCC), 4.7nF, ±10%, 50V, X7R, ±10%, SMD 0402; Manufacturer: PSA(Prosperity Dielectrics); Manufacturer Part Number: FN15X472K500PNG; Package Size: 0402; JLCPCB Basic Part: No; JLCPCB Part Number: C363541; Supplier 1: LCSC; Category: Capacitors - MLCC; Supplier Part Number 1: C363541; Tolerance: ±10%; Voltage Rating: 50V; Temperature Coefficient: X7R; RoHS: Yes; ComponentLink1Description: Datasheet; ComponentLink1URL: https://wmsc.lcsc.com/wmsc/upload/file/pdf/v2/lcsc/2304140030_PSA-Prosperity-Dielectrics-FN15X472K500PNG_C363541.pdf; ComponentLink2Description: JLCPCB Part URL; ComponentLink2URL: https://jlcpcb.com/partdetail/C363541; ComponentLink3Description: LCSC Part URL; ComponentLink3URL: https://lcsc.com/product-detail/Multilayer-Ceramic-Capacitors-MLCC---SMD-SMT_PSAProsperity-Dielectrics-PSAProsperity-Dielectrics-FN15X472K500PNG_C363541.html
footprint CAP-0402 (0402 (1005M) Capacitor)
pins: 1, 2

## FN15X473K160PNG
designator C?  Capacitance: 47nF  (hidden comment: *)
Capacitor, Ceramic (MLCC), 47nF, ±10%, 16V, X7R, ±10%, SMD 0402; Manufacturer: PSA(Prosperity Dielectrics); Manufacturer Part Number: FN15X473K160PNG; Package Size: 0402; JLCPCB Basic Part: No; JLCPCB Part Number: C363542; Supplier 1: LCSC; Category: Capacitors - MLCC; Supplier Part Number 1: C363542; Tolerance: ±10%; Voltage Rating: 16V; Temperature Coefficient: X7R; RoHS: Yes; ComponentLink1Description: Datasheet; ComponentLink1URL: https://wmsc.lcsc.com/wmsc/upload/file/pdf/v2/lcsc/2304140030_PSA-Prosperity-Dielectrics-FN15X473K160PNG_C363542.pdf; ComponentLink2Description: JLCPCB Part URL; ComponentLink2URL: https://jlcpcb.com/partdetail/C363542; ComponentLink3Description: LCSC Part URL; ComponentLink3URL: https://lcsc.com/product-detail/Multilayer-Ceramic-Capacitors-MLCC---SMD-SMT_PSAProsperity-Dielectrics-PSAProsperity-Dielectrics-FN15X473K160PNG_C363542.html
footprint CAP-0402 (0402 (1005M) Capacitor)
pins: 1, 2

## FN15X473K250PNG
designator C?  Capacitance: 47nF  (hidden comment: *)
Capacitor, Ceramic (MLCC), 47nF, ±10%, 25V, X7R, ±10%, SMD 0402; Manufacturer: PSA(Prosperity Dielectrics); Manufacturer Part Number: FN15X473K250PNG; Package Size: 0402; JLCPCB Basic Part: No; JLCPCB Part Number: C363543; Supplier 1: LCSC; Category: Capacitors - MLCC; Supplier Part Number 1: C363543; Tolerance: ±10%; Voltage Rating: 25V; Temperature Coefficient: X7R; RoHS: Yes; ComponentLink1Description: Datasheet; ComponentLink1URL: https://wmsc.lcsc.com/wmsc/upload/file/pdf/v2/lcsc/2304140030_PSA-Prosperity-Dielectrics-FN15X473K250PNG_C363543.pdf; ComponentLink2Description: JLCPCB Part URL; ComponentLink2URL: https://jlcpcb.com/partdetail/C363543; ComponentLink3Description: LCSC Part URL; ComponentLink3URL: https://lcsc.com/product-detail/Multilayer-Ceramic-Capacitors-MLCC---SMD-SMT_PSAProsperity-Dielectrics-PSAProsperity-Dielectrics-FN15X473K250PNG_C363543.html
footprint CAP-0402 (0402 (1005M) Capacitor)
pins: 1, 2

## FN15X561K250PNG
designator C?  Capacitance: 560pF  (hidden comment: *)
Capacitor, Ceramic (MLCC), 560pF, ±10%, 25V, X7R, ±10%, SMD 0402; Manufacturer: PSA(Prosperity Dielectrics); Manufacturer Part Number: FN15X561K250PNG; Package Size: 0402; JLCPCB Basic Part: No; JLCPCB Part Number: C565559; Supplier 1: LCSC; Category: Capacitors - MLCC; Supplier Part Number 1: C565559; Tolerance: ±10%; Voltage Rating: 25V; Temperature Coefficient: X7R; RoHS: Yes; ComponentLink1Description: Datasheet; ComponentLink2Description: JLCPCB Part URL; ComponentLink2URL: https://jlcpcb.com/partdetail/C565559; ComponentLink3Description: LCSC Part URL; ComponentLink3URL: https://lcsc.com/product-detail/Multilayer-Ceramic-Capacitors-MLCC---SMD-SMT_PSAProsperity-Dielectrics-PSAProsperity-Dielectrics-FN15X561K250PNG_C565559.html
footprint CAP-0402 (0402 (1005M) Capacitor)
pins: 1, 2

## FN15X561K500PNG
designator C?  Capacitance: 560pF  (hidden comment: *)
Capacitor, Ceramic (MLCC), 560pF, ±10%, 50V, X7R, ±10%, SMD 0402; Manufacturer: PSA(Prosperity Dielectrics); Manufacturer Part Number: FN15X561K500PNG; Package Size: 0402; JLCPCB Basic Part: No; JLCPCB Part Number: C363544; Supplier 1: LCSC; Category: Capacitors - MLCC; Supplier Part Number 1: C363544; Tolerance: ±10%; Voltage Rating: 50V; Temperature Coefficient: X7R; RoHS: Yes; ComponentLink1Description: Datasheet; ComponentLink1URL: https://wmsc.lcsc.com/wmsc/upload/file/pdf/v2/lcsc/2304140030_PSA-Prosperity-Dielectrics-FN15X561K500PNG_C363544.pdf; ComponentLink2Description: JLCPCB Part URL; ComponentLink2URL: https://jlcpcb.com/partdetail/C363544; ComponentLink3Description: LCSC Part URL; ComponentLink3URL: https://lcsc.com/product-detail/Multilayer-Ceramic-Capacitors-MLCC---SMD-SMT_PSAProsperity-Dielectrics-PSAProsperity-Dielectrics-FN15X561K500PNG_C363544.html
footprint CAP-0402 (0402 (1005M) Capacitor)
pins: 1, 2
